# Altium footprint library MiscDevices.PcbLib: 251 footprints (part 2 of 16)
Each footprint in its own frame and in the unit in brackets; x right, y up, seen from the top. Pads: shape width x height; smd on the part's side, far side on the other; paste and mask are expansions set on the pad; w line width, h text height; cw(c..) or ccw(c..) is an arc to the next point about the centre after c.
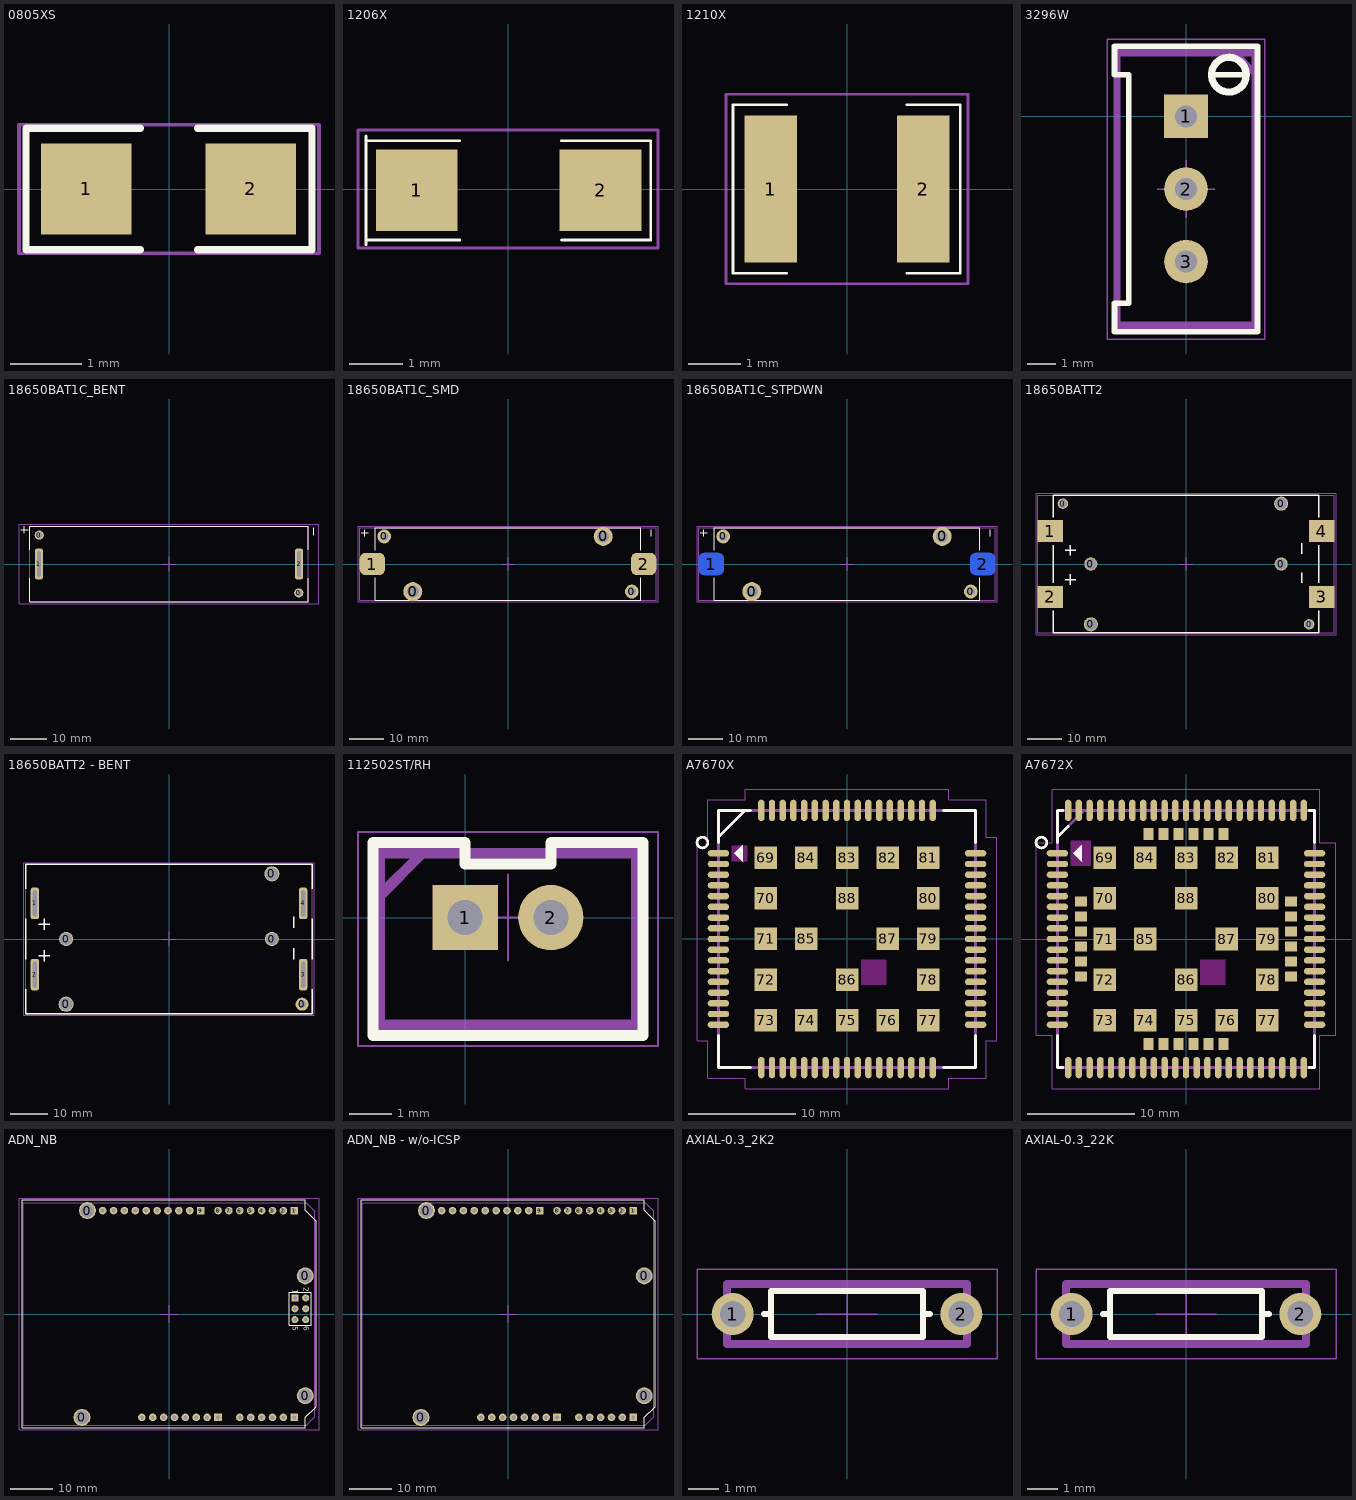
[diagram p1: the footprints below, top view; thin cyan lines are the x and y axes]

## 0805XS [mil] "Chip RLC 0805 ;"
height 23.62
pads (2):
  rect 50x50 smd: 1(-45.55,0) 2(45,0)
Top Overlay:
  lines w3.94: -15.75,-33.47 -78.74,-33.47 -78.74,33.46 -15.75,33.46 ; 15.75,-33.47 78.74,-33.47 78.74,33.46 15.75,33.46
Top Designator (Mech7):
  text ".Designator" at -55.59,-10 h30
Top Courtyard:
  lines w1.97: -82.68,-35.43 82.68,-35.43 82.68,35.43 -82.68,35.43 -82.68,-35.43

## 1206X [mil] "Chip RLC 1206;"
pads (2):
  rect 60x60 smd: 1(-67,-1) 2(68,-1)
Top Overlay:
  lines w2: -104.33,-41 -104.33,39 ; -104.33,-37.4 -35.43,-37.4 ; -104.33,35.44 -35.43,35.44 ; 39.37,-37.4 105,-37.4 105,35.44 39.37,35.44
Top Designator (Mech7):
  text ".Designator" at -79.21,-10 h30
Top Courtyard:
  lines w1.97: -110.24,-43.31 -110.24,43.31 110.24,43.31 110.24,-43.31 -110.24,-43.31

## 1210X [mm]
height 10
pads (2):
  rect 1x2.8 smd: 1(-1.45,0) 2(1.45,0)
Top Overlay:
  lines w0.051: -1.15,-1.6 -2.166,-1.6 -2.166,1.6 -1.15,1.6 ; 1.136,-1.6 2.152,-1.6 2.152,1.6 1.136,1.6
Top Designator (Mech7):
  text ".Designator" at -1.387,-0.254 h0.76
Top Courtyard:
  lines w0.05: -2.3,-1.8 -2.3,1.8 2.3,1.8 2.3,-1.8 -2.3,-1.8

## 3296W [mil] "3296-3/8 Square Trimming Pot Ver adj."
pads (3):
  rect 60x60 hole 30: 1(0,0)
  round 60 hole 30: 2(0,-100) 3(0,-200)
Top Overlay:
  circle w10: c59.06,57.48 r23.95
  lines w7.87: 35.43,57.48 83,57.48 ; -98.43,-296.85 98.43,-296.85 98.43,96.85 -98.43,96.85 -98.43,57.48 -78.74,57.48 -78.74,-257.48 -98.43,-257.48 -98.43,-296.85
Top Designator (Mech7):
  text ".Designator" at -239.92,-9.37 h48
Top Assembly:
  lines w10: 59.06,87.6 66.52,87.6 95.07,59.06 ; -95.08,-287.59 -95.08,87.6 95.07,87.6 95.07,-287.59 -95.08,-287.59
Top Courtyard:
  lines w1.97: -39.37,-100 39.37,-100 ; 0,-139.37 0,-60.63 ; -108.27,-306.69 108.27,-306.69 108.27,106.69 -108.27,106.69 -108.27,-306.69
3D body "User Library-3296_Bourns.STEP": height 455.22, standoff -299.5, extent -95.08,-287.6 95.08,87.6

## 18650BAT1C_BENT [mm] "Battery 18650 Holder 1 Cell"
height 18
pads (4):
  round 2.54 hole 1.676: 0(-35.9,8) 0(35.9,-8)
  rrect50% 2.2x8.5 hole 1 slot 7 at 90 deg: 1(-36,0) 2(36,0)
Top Overlay:
  lines w0.254: -41,9.5 -39,9.5 ; -40,8.5 -40,10.5 ; -38.55,-4 -38.55,-10.5 38.55,-10.5 38.55,-4 ; -38.55,4 -38.55,10.5 38.55,10.5 38.55,4 ; 40,8 40,10
Top Designator (Mech7):
  text ".Designator" at -7.618,-0.508 h1.52
Top Assembly:
  lines w0.254: -38.5,-10.5 -38.5,10.5 38.5,10.5 38.5,-10.5 -38.5,-10.5
Top Courtyard:
  lines w0.05: -2,0 2,0 ; 0,-2 0,2 ; -41.5,-11 -41.5,11 41.5,11 41.5,-11 -41.5,-11
3D body "User Library-KEYS1042.STEP": height 14.86, standoff -3.29, extent -38.525,-10.325 38.525,10.325

## 18650BAT1C_SMD [mm] "Battery 18650 Holder 1 Cell"
height 18
pads (6):
  round 4 hole 2.4: 0(-35.9,8) 0(35.9,-8)
  round 5.5 hole 3.5: 0(-27.6,-8) 0(27.6,8)
  rrect50% 7.3x6.4 smd: 1(-39.35,0) 2(39.35,0)
Top Overlay:
  lines w0.254: -42.5,9 -40.5,9 ; -41.5,8 -41.5,10 ; -38.55,-4 -38.55,-10.5 38.55,-10.5 38.55,-4 ; -38.55,4 -38.55,10.5 38.55,10.5 38.55,4 ; 41.5,8 41.5,10
Top Designator (Mech7):
  text ".Designator" at -7.618,-0.508 h1.52
Top Assembly:
  lines w0.254: -43,-10.5 -43,10.5 43,10.5 43,-10.5 -43,-10.5
Top Courtyard:
  lines w0.05: -2,0 2,0 ; 0,-2 0,2 ; -43.5,-11 43.5,-11 43.5,11 -43.5,11 -43.5,-11
3D body "keystone_1042.sldprt": height 14.99, standoff -3.17, extent -42.898,-10.326 43.106,10.324

## 18650BAT1C_STPDWN [mm] "Battery 18650 Holder 1 Cell"
height 16.5
pads (6):
  round 4 hole 2.4: 0(-35.9,8) 0(35.9,-8)
  round 5.5 hole 3.5: 0(-27.6,-8) 0(27.6,8)
  rrect50% 7.3x6.4 smd far side: 1(-39.35,0) 2(39.35,0)
Top Overlay:
  lines w0.254: -42.5,9 -40.5,9 ; -41.5,8 -41.5,10 ; -38.55,-4 -38.55,-10.5 38.55,-10.5 38.55,-4 ; -38.55,4 -38.55,10.5 38.55,10.5 38.55,4 ; 41.5,8 41.5,10
Top Designator (Mech7):
  text ".Designator" at -7.618,-0.508 h1.52
Top Assembly:
  lines w0.254: -43,-10.5 -43,10.5 43,10.5 43,-10.5 -43,-10.5
Top Courtyard:
  lines w0.05: -2,0 2,0 ; 0,-2 0,2 ; -43.5,-11 43.5,-11 43.5,11 -43.5,11 -43.5,-11
3D body "keystone_1042.sldprt": height 13.46, standoff -4.7, extent -42.898,-10.326 43.106,10.324

## 18650BATT2 [mm] "18650 Battery Holder 2 Cell"
height 18
pads (10):
  round 3.048 hole 2.4: 0(-35.7,17.5) 0(35.7,-17.5)
  round 4.064 hole 3.5: 0(-27.6,-17.5) 0(27.6,17.5)
  round 3.81 hole 3.2: 0(-27.6,0) 0(27.6,0)
  rect 7.3x6.4 smd: 1(-39.35,9.55) 2(-39.35,-9.55) 3(39.35,-9.55) 4(39.35,9.55)
Top Overlay:
  lines w0.4: -38.5,-13.5 -38.5,-20 38.5,-20 38.5,-13.5 ; -38.5,-5.5 -38.5,5.5 ; -38.5,13.5 -38.5,20 38.5,20 38.5,13.5 ; -35,-4.5 -32,-4.5 ; -35,4 -32,4 ; -33.5,-6 -33.5,-3 ; -33.5,2.5 -33.5,5.5 ; 33.5,-5.5 33.5,-2.5 ; 33.5,3 33.5,6 ; 38.5,-5.5 38.5,5.5
Top Designator (Mech7):
  text ".Designator" at -7.618,-0.508 h1.52
Top Assembly:
  lines w0.254: -43,-20 -43,20 43,20 43,-20 -43,-20
Top Courtyard:
  lines w0.05: -2,0 2,0 ; 0,-2 0,2 ; -43.5,-20.5 43.5,-20.5 43.5,-7 43.5,20.5 -43.5,20.5 -43.5,-20.5
3D body "keystone-PN1047.STEP": height 14.91, standoff -3.43, extent -40.515,-19.825 40.515,19.951

## 18650BATT2 - BENT [mm] "18650 Battery Holder 2 Cell"
height 18
pads (9):
  round 4.064 hole 3.5: 0(-27.6,-17.5) 0(27.6,17.5)
  round 3.81 hole 3.2: 0(-27.6,0) 0(27.6,0)
  round 3.5 hole 2: 0(35.7,-17.5)
  rrect50% 2.2x8.5 hole 1 slot 7 at 90 deg: 1(-36,9.55) 2(-36,-9.55) 3(36,-9.55) 4(36,9.55)
Top Overlay:
  lines w0.4: -38.5,-13.5 -38.5,-20 38.5,-20 38.5,-13.5 ; -38.5,-5.5 -38.5,5.5 ; -38.5,13.5 -38.5,20 38.5,20 38.5,13.5 ; -35,-4.5 -32,-4.5 ; -35,4 -32,4 ; -33.5,-6 -33.5,-3 ; -33.5,2.5 -33.5,5.5 ; 33.5,-5.5 33.5,-2.5 ; 33.5,3 33.5,6 ; 38.5,-5.5 38.5,5.5
Top Designator (Mech7):
  text ".Designator" at -7.618,-0.508 h1.52
Top Assembly:
  lines w0.254: -38.5,-20 38.5,-20 38.5,20 -38.5,20 -38.5,-20
Top Courtyard:
  lines w0.05: -2,0 2,0 ; 0,-2 0,2 ; -39,-20.5 -39,20.5 39,20.5 39,-20.5 -39,-20.5
3D body "1047.SLDPRT": height 14.91, standoff -3.43, extent -38.528,-19.825 38.528,19.951

## 112502ST/RH [mil] "WAFER Connector 2 Pins,Pitch 2.00mm, Straight Type  Single Row"
height 236.22
pads (2):
  rect 60x60 hole 32: 1(0,0)
  round 60 hole 32: 2(78.74,0)
Top Overlay:
  lines w10: -84.65,-108.27 -84.65,68.9 0,68.9 0,49.21 78.74,49.21 78.74,68.9 163.39,68.9 163.39,-108.27 -84.65,-108.27
Top Designator (Mech7):
  text ".Designator" at -260.53,-39.68 h60
Top Assembly:
  lines w10: -78.74,19.68 -39.37,59.05 ; -39.37,59.05 -39.37,59.06 ; -78.74,-98.43 157.48,-98.43 157.48,59.06 -78.74,59.06 -78.74,-98.43
Top Courtyard:
  lines w1.97: 0,0 78.74,0 ; 39.37,-39.37 39.37,39.37 ; -98.43,-118.11 177.17,-118.11 177.17,78.74 -98.43,78.74 -98.43,-118.11

## A7670X [mm] "LCC+LGA Package 88pin"
height 2.7
pads (88):
  oval 2x0.6 smd: 1(-12,8) 2(-12,7) 3(-12,6) 4(-12,5) 5(-12,4) 6(-12,3) 7(-12,2) 8(-12,1) 9(-12,0) 10(-12,-1) 11(-12,-2) 12(-12,-3) 13(-12,-4) 14(-12,-5) 15(-12,-6) 16(-12,-7) 17(-12,-8) 35(12,-8) 36(12,-7) 37(12,-6) 38(12,-5) 39(12,-4) 40(12,-3) 41(12,-2) 42(12,-1) 43(12,0) 44(12,1) 45(12,2) 46(12,3) 47(12,4) 48(12,5) 49(12,6) 50(12,7) 51(12,8)
  oval 0.6x2 smd: 18(-8,-12) 19(-7,-12) 20(-6,-12) 21(-5,-12) 22(-4,-12) 23(-3,-12) 24(-2,-12) 25(-1,-12) 26(0,-12) 27(1,-12) 28(2,-12) 29(3,-12) 30(4,-12) 31(5,-12) 32(6,-12) 33(7,-12) 34(8,-12) 52(8,12) 53(7,12) 54(6,12) 55(5,12) 56(4,12) 57(3,12) 58(2,12) 59(1,12) 60(0,12) 61(-1,12) 62(-2,12) 63(-3,12) 64(-4,12) 65(-5,12) 66(-6,12) 67(-7,12) 68(-8,12)
  rect 2.1x2.1 smd: 69(-7.6,7.6) 70(-7.6,3.8) 71(-7.6,0) 72(-7.6,-3.8) 73(-7.6,-7.6) 74(-3.8,-7.6) 75(0,-7.6) 76(3.8,-7.6) 77(7.6,-7.6) 78(7.6,-3.8) 79(7.6,0) 80(7.6,3.8) 81(7.6,7.6) 82(3.8,7.6) 83(0,7.6) 84(-3.8,7.6) 85(-3.8,0) 86(0,-3.8) 87(3.8,0) 88(0,3.8)
Top Layer keep-out:
  rectangle: -10.8,7.25 -9.3,8.75
  rectangle: 1.3,-4.3 3.7,-1.9
Top Overlay:
  circle w0.254: c-13.5,9 r0.5
  region: -10.5,8 -9.75,8.75 -9.75,7.25
  lines w0.1: -10.5,8 -10.5,8 ; -10.5,8 -9.75,8.75 -9.75,7.25 -10.5,8
  lines w0.254: -12,-9 -12,-12 -9,-12 ; -12,9 -12,12 -9,12 ; -12,9.5 -9.5,12 ; 9,-12 12,-12 12,-9 ; 9,12 12,12 12,9
Top Designator (Mech7):
  text ".Designator" at -7.618,-0.508 h1.52
Top Assembly:
  lines w0.254: -12,9.5 -9.5,12 ; -12,-12 -12,12 12,12 12,-12 -12,-12
Top Courtyard:
  lines w0.1: -14,-9.5 -14,9.5 -13,9.5 -13,13 -9.5,13 -9.5,14 9.5,14 9.5,13 13,13 13,9.5 14,9.5 14,-9.5 13,-9.5 13,-13 9.5,-13 9.5,-14 -9.5,-14 -9.5,-13 -13,-13 -13,-9.5 -14,-9.5
3D body "User Library-A7670.STEP": height 2.31, standoff 0.01, extent -12,-12 12,12

## A7672X [mm] "LCC+LGA Package 124pin"
height 2.7
pads (124):
  oval 2x0.6 smd: 1(-12,8) 2(-12,7) 3(-12,6) 4(-12,5) 5(-12,4) 6(-12,3) 7(-12,2) 8(-12,1) 9(-12,0) 10(-12,-1) 11(-12,-2) 12(-12,-3) 13(-12,-4) 14(-12,-5) 15(-12,-6) 16(-12,-7) 17(-12,-8) 35(12,-8) 36(12,-7) 37(12,-6) 38(12,-5) 39(12,-4) 40(12,-3) 41(12,-2) 42(12,-1) 43(12,0) 44(12,1) 45(12,2) 46(12,3) 47(12,4) 48(12,5) 49(12,6) 50(12,7) 51(12,8)
  oval 0.6x2 smd: 18(-8,-12) 19(-7,-12) 20(-6,-12) 21(-5,-12) 22(-4,-12) 23(-3,-12) 24(-2,-12) 25(-1,-12) 26(0,-12) 27(1,-12) 28(2,-12) 29(3,-12) 30(4,-12) 31(5,-12) 32(6,-12) 33(7,-12) 34(8,-12) 52(8,12) 53(7,12) 54(6,12) 55(5,12) 56(4,12) 57(3,12) 58(2,12) 59(1,12) 60(0,12) 61(-1,12) 62(-2,12) 63(-3,12) 64(-4,12) 65(-5,12) 66(-6,12) 67(-7,12) 68(-8,12) 89(-11,-12) 90(-10,-12) 91(-9,-12) 92(9,-12) 93(10,-12) 94(11,-12) 95(11,12) 96(10,12) 97(9,12) 98(-9,12) 99(-10,12) 100(-11,12)
  rect 2.1x2.1 smd: 69(-7.6,7.6) 70(-7.6,3.8) 71(-7.6,0) 72(-7.6,-3.8) 73(-7.6,-7.6) 74(-3.8,-7.6) 75(0,-7.6) 76(3.8,-7.6) 77(7.6,-7.6) 78(7.6,-3.8) 79(7.6,0) 80(7.6,3.8) 81(7.6,7.6) 82(3.8,7.6) 83(0,7.6) 84(-3.8,7.6) 85(-3.8,0) 86(0,-3.8) 87(3.8,0) 88(0,3.8)
  rect 1.1x0.9 smd: 101(-9.8,3.5) 102(-9.8,2.1) 103(-9.8,0.7) 104(-9.8,-0.7) 105(-9.8,-2.1) 106(-9.8,-3.5) 113(9.8,-3.5) 114(9.8,-2.1) 115(9.8,-0.7) 116(9.8,0.7) 117(9.8,2.1) 118(9.8,3.5)
  rect 0.9x1.1 smd: 107(-3.5,-9.8) 108(-2.1,-9.8) 109(-0.7,-9.8) 110(0.7,-9.8) 111(2.1,-9.8) 112(3.5,-9.8) 119(3.5,9.8) 120(2.1,9.8) 121(0.7,9.8) 122(-0.7,9.8) 123(-2.1,9.8) 124(-3.5,9.8)
Top Layer keep-out:
  rectangle: -10.8,6.8 -8.85,9.2
  rectangle: 1.3,-4.3 3.7,-1.9
Top Overlay:
  circle w0.254: c-13.5,9 r0.5
  region: -10.5,8 -9.75,8.75 -9.75,7.25
  lines w0.1: -10.5,8 -10.5,8 ; -10.5,8 -9.75,8.75 -9.75,7.25 -10.5,8
  lines w0.254: -12,-9 -12,-12 -11.5,-12 ; -12,9 -12,12 -11.5,12 ; -12,9.5 -11,10.5 ; 11.5,-12 12,-12 12,-9 ; 11.5,12 12,12 12,9
Top Designator (Mech7):
  text ".Designator" at -7.618,-0.508 h1.52
Top Assembly:
  lines w0.254: -12,9.5 -9.5,12 ; -12,-12 -12,12 12,12 12,-12 -12,-12
Top Courtyard:
  lines w0.1: -14,-9 -14,9 -12.5,9 -12.5,14 12.5,14 12.5,9 14,9 14,-9 12.5,-9 12.5,-14 -12.5,-14 -12.5,-9 -14,-9
3D body "SIM7672_3.step": height 3.03, standoff 0.01, extent -12.002,-12.003 12.003,12.003

## ADN_NB [mil] "Arduino Shield Cat. M1/NB"
height 472.44
pads (42):
  round 155 hole 125: 0(-799.41,-950) 0(-749.41,950) 0(1250.59,-750) 0(1250.59,350)
  rect 70x70 hole 36: 1(1150.59,950) 9(290.59,950) 26(450.59,-950) 32(1150.59,-950)
  round 70 hole 36: 2(1050.59,950) 3(950.59,950) 4(850.59,950) 5(750.59,950) 6(650.59,950) 7(550.59,950) 8(450.59,950) 10(190.59,950) 11(90.59,950) 12(-9.41,950) 13(-109.41,950) 14(-209.41,950) 15(-309.41,950) 16(-409.41,950) 17(-509.41,950) 18(-609.41,950) 19(-249.41,-950) 20(-149.41,-950) 21(-49.41,-950) 22(50.59,-950) 23(150.59,-950) 24(250.59,-950) 25(350.59,-950) 27(650.59,-950) 28(750.59,-950) 29(850.59,-950) 30(950.59,-950) 31(1050.59,-950)
  rect 65x65 hole 36: 33(1156.1,148.03)
  round 65 hole 36: 34(1256.1,148.03) 35(1156.1,48.03) 36(1256.1,48.03) 37(1156.1,-51.97) 38(1256.1,-51.97)
Top Overlay:
  lines w7.87: 1106.1,89.7 1106.1,-101.97 ; 1106.1,-101.97 1106.1,198.03 1306.1,198.03 1306.1,-101.97 1106.1,-101.97
  lines w10: -1350.39,-1047.24 1249.21,-1047.24 1250.59,-1045.87 1250.59,-950 1350.59,-850 1350.59,852.76 1251.97,951.38 1251.97,1051.18 -1350.39,1051.18 -1350.39,-1047.24
  text "1" at 1136.1,228.03 h50
  text "2" at 1236.1,248.03 h50
  text "5" at 1136.1,-111.97 h50
  text "6" at 1236.1,-111.97 h50
Top Designator (Mech7):
  text ".Designator" at -299.8,-18.02 h60
Top Assembly:
  lines w10: -1338.58,-1023.62 1259.84,-1023.62 1338.58,-944.88 1338.58,944.88 1259.84,1023.62 -1338.58,1023.62 -1338.58,-1023.62
Top Courtyard:
  lines w1.97: -78.74,0 78.74,0 ; 0,-78.74 0,78.74 ; -1377.95,-1062.99 -1377.95,1062.99 1377.95,1062.99 1377.95,-1062.99 -1377.95,-1062.99
3D body "1x6F_HEADER.SLDPRT": height 334.65, standoff -137.8, extent 588.78,-1000 1212.4,-900
3D body "1x8F_HEADER.SLDPRT": height 334.65, standoff -137.8, extent -311.22,-1000 512.4,-900
3D body "1x8F_HEADER.SLDPRT": height 334.65, standoff -137.8, extent 388.78,900 1212.4,1000
3D body "1x10F_HEADER.SLDPRT": height 334.65, standoff -137.8, extent -671.22,900 352.4,1000

## ADN_NB - w/o-ICSP [mil] "Arduino Shield Cat. M1/NB"
height 472.44
pads (36):
  round 155 hole 125: 0(-799.41,-950) 0(-749.41,950) 0(1250.59,-750) 0(1250.59,350)
  rect 70x70 hole 36: 1(1150.59,950) 9(290.59,950) 26(450.59,-950) 32(1150.59,-950)
  round 70 hole 36: 2(1050.59,950) 3(950.59,950) 4(850.59,950) 5(750.59,950) 6(650.59,950) 7(550.59,950) 8(450.59,950) 10(190.59,950) 11(90.59,950) 12(-9.41,950) 13(-109.41,950) 14(-209.41,950) 15(-309.41,950) 16(-409.41,950) 17(-509.41,950) 18(-609.41,950) 19(-249.41,-950) 20(-149.41,-950) 21(-49.41,-950) 22(50.59,-950) 23(150.59,-950) 24(250.59,-950) 25(350.59,-950) 27(650.59,-950) 28(750.59,-950) 29(850.59,-950) 30(950.59,-950) 31(1050.59,-950)
Top Overlay:
  lines w10: -1350.39,-1047.24 1249.21,-1047.24 1250.59,-1045.87 1250.59,-950 1350.59,-850 1350.59,852.76 1251.97,951.38 1251.97,1051.18 -1350.39,1051.18 -1350.39,-1047.24
Top Designator (Mech7):
  text ".Designator" at -299.8,-18.02 h60
Top Assembly:
  lines w10: -1338.58,-1023.62 -1338.58,1023.62 1259.84,1023.62 1338.58,944.88 1338.58,-944.88 1259.84,-1023.62 -1338.58,-1023.62
Top Courtyard:
  lines w1.97: -78.74,0 78.74,0 ; 0,-78.74 0,78.74 ; -1377.95,-1062.99 1377.95,-1062.99 1377.95,1062.99 -1377.95,1062.99 -1377.95,-1062.99
3D body "1x8F_HEADER.SLDPRT": height 334.65, standoff -137.8, extent 388.78,900 1212.4,1000
3D body "1x10F_HEADER.SLDPRT": height 334.65, standoff -137.8, extent -671.22,900 352.4,1000
3D body "1x6F_HEADER.SLDPRT": height 334.65, standoff -137.8, extent 588.78,-1000 1212.4,-900
3D body "1x8F_HEADER.SLDPRT": height 334.65, standoff -137.8, extent -311.22,-1000 512.4,-900

## AXIAL-0.3_2K2 [mm] "Axial Device, Thru-Hole; 2 Leads; 0.3 in Pin Spacing"
height 1.524
pads (2):
  round 1.4 hole 0.85: 1(-3.81,0) 2(3.81,0)
Top Overlay:
  lines w0.2: -2.769,0 -2.54,0 ; 2.769,0 2.54,0 ; 2.54,0 2.54,0.762 -2.54,0.762 -2.54,-0.762 2.54,-0.762 2.54,0
Top Designator (Mech7):
  text ".Designator" at -6.094,-0.352 h1.22
Top Assembly:
  lines w0.254: -4,-1 4,-1 4,1 -4,1 -4,-1
Top Courtyard:
  lines w0.05: -1,0 1,0 ; 0,-1 0,1 ; -5,-1.5 -5,1.5 5,1.5 5,-1.5 -5,-1.5
3D body "R-Axial-0_25W-7_62_2K2.STEP": height 3.7, standoff -2.5, extent -4.11,-1.203 4.11,1.203

## AXIAL-0.3_22K [mm] "Axial Device, Thru-Hole; 2 Leads; 0.3 in Pin Spacing"
height 1.524
pads (2):
  round 1.4 hole 0.85: 1(-3.81,0) 2(3.81,0)
Top Overlay:
  lines w0.2: -2.769,0 -2.54,0 ; 2.769,0 2.54,0 ; 2.54,0 2.54,0.762 -2.54,0.762 -2.54,-0.762 2.54,-0.762 2.54,0
Top Designator (Mech7):
  text ".Designator" at -2.603,-0.406 h1.22
Top Assembly:
  lines w0.254: -4,-1 -4,1 4,1 4,-1 -4,-1
Top Courtyard:
  lines w0.05: -1,0 1,0 ; 0,-1 0,1 ; -5,-1.5 -5,1.5 5,1.5 5,-1.5 -5,-1.5
3D body "R-Axial-0_25W-7_62_22K.STEP": height 3.7, standoff -2.5, extent -4.11,-1.203 4.11,1.203